# Altium footprint library TranDangKhoa-LIB.PcbLib: 1435 footprints (part 70 of 90)
Each footprint in its own frame and in the unit in brackets; x right, y up, seen from the top. Pads: shape width x height; smd on the part's side, far side on the other; paste and mask are expansions set on the pad; w line width, h text height; cw(c..) or ccw(c..) is an arc to the next point about the centre after c.
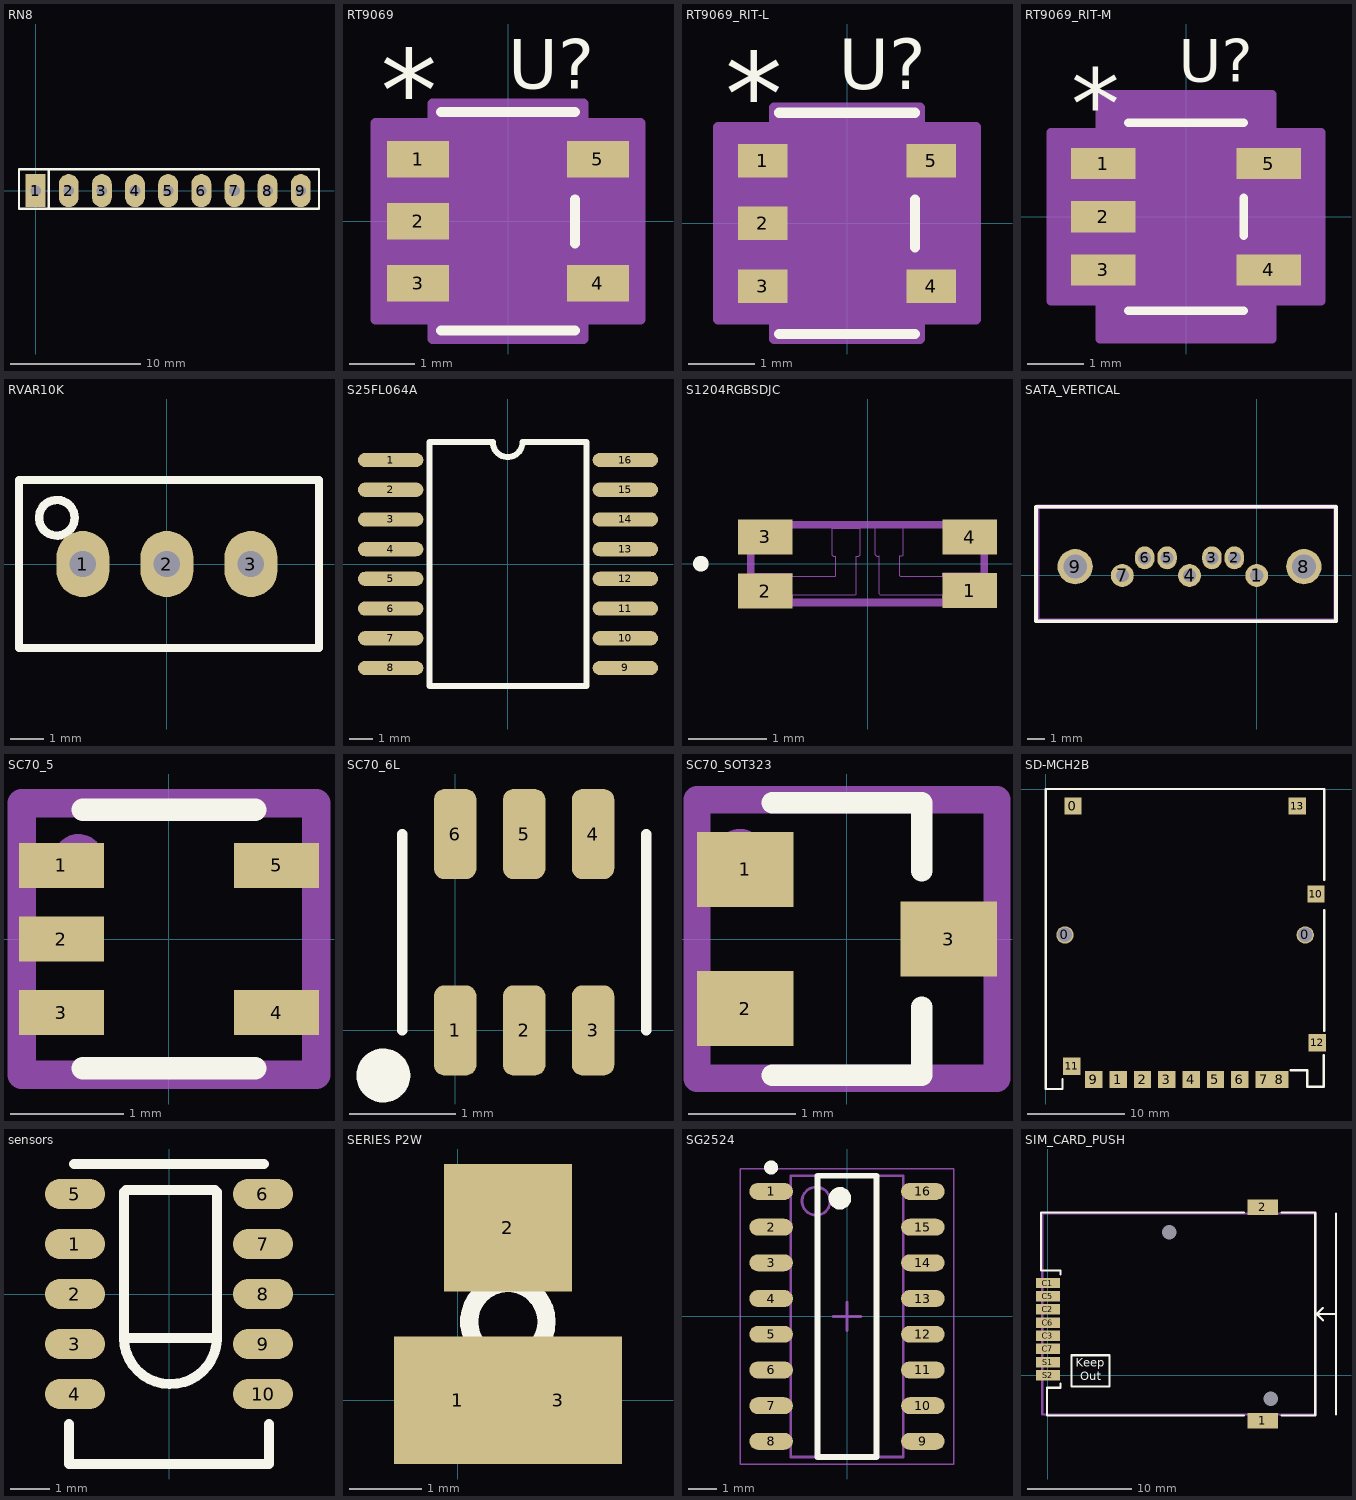
[diagram p69: the footprints below, top view; thin cyan lines are the x and y axes]

## RN8 [mil] "R SIP8, 9 Pin"
height 200
pads (9):
  rect 60x100 hole 32: 1(0,0)
  oval 60x100 hole 32: 2(100,0) 3(200,0) 4(300,0) 5(400,0) 6(500,0) 7(600,0) 8(700,0) 9(800,0)
Top Overlay:
  lines w7: 40,-55 40,65 ; -50,-55 -50,65 855,65 855,-55 -50,-55
3D body "SW3dPS-Resistor Networks-1.STEP": height 259.29, standoff -75.35, extent -42.91,-44.21 842.91,5

## RT9069 [mil]
pads (5):
  rect 37.5x22 smd paste+0 mask+0: 1(-54.25,37.4) 2(-54.25,0) 3(-54.25,-37.4) 4(54.25,-37.4) 5(54.25,37.4)
Top Overlay:
  lines w6: -40.5,-66 40.5,-66 ; -40.5,66 40.5,66 ; 40.5,-13.3 40.5,13.3
  text "U?" at 0,80 h30
  text "*" at -76.75,54.4 h50
Mechanical 13:
  lines w0: -12,61 ccw(c0,61) 12,61
  lines w1: -59,-48.4 -59,-26.4 -35.5,-26.4 -35.5,-48.4 -59,-48.4 ; -59,-11 -59,11 -35.5,11 -35.5,-11 -59,-11 ; -59,26.4 -59,48.4 -35.5,48.4 -35.5,26.4 -59,26.4 ; -35.5,-61 35.5,-61 35.5,61 -35.5,61 -35.5,-61 ; 35.5,-48.4 35.5,-26.4 59,-26.4 59,-48.4 35.5,-48.4 ; 35.5,26.4 35.5,48.4 59,48.4 59,26.4 35.5,26.4
  text "*" at -38,11.4 h50
Mechanical 15:
  region: 45.5,-71 -45.5,-71 -45.5,-59.4 -80,-59.4 -80,59.4 -45.5,59.4 -45.5,71 45.5,71 45.5,59.4 80,59.4 80,-59.4 45.5,-59.4
  lines w6: -80,-59.4 -45.5,-59.4 -45.5,-71 45.5,-71 45.5,-59.4 80,-59.4 80,59.4 45.5,59.4 45.5,71 -45.5,71 -45.5,59.4 -80,59.4 -80,-59.4
3D body "SOT_69-C0GB_RIT.step": height 51.1, standoff 0, extent -59.02,-60.98 59.02,60.98

## RT9069_RIT-L [mil]
pads (5):
  rect 29.5x20 smd paste+0 mask+0: 1(-50.25,37.4) 2(-50.25,0) 3(-50.25,-37.4) 4(50.25,-37.4) 5(50.25,37.4)
Top Overlay:
  lines w6: -40.5,-66 40.5,-66 ; -40.5,66 40.5,66 ; 40.5,-14.3 40.5,14.3
  text "U?" at -5,80 h30
  text "*" at -72.75,52.4 h50
Mechanical 13:
  lines w0: -12,61 ccw(c0,61) 12,61
  lines w1: -59,-48.4 -35.5,-48.4 -35.5,-26.4 -59,-26.4 -59,-48.4 ; -59,-11 -35.5,-11 -35.5,11 -59,11 -59,-11 ; -59,26.4 -35.5,26.4 -35.5,48.4 -59,48.4 -59,26.4 ; -35.5,-61 -35.5,61 35.5,61 35.5,-61 -35.5,-61 ; 35.5,-48.4 59,-48.4 59,-26.4 35.5,-26.4 35.5,-48.4 ; 35.5,26.4 59,26.4 59,48.4 35.5,48.4 35.5,26.4
  text "*" at -38,9.4 h50
Mechanical 15:
  region: 43.5,-69 -43.5,-69 -43.5,-57.4 -77,-57.4 -77,57.4 -43.5,57.4 -43.5,69 43.5,69 43.5,57.4 77,57.4 77,-57.4 43.5,-57.4
  lines w6: -77,-57.4 -77,57.4 -43.5,57.4 -43.5,69 43.5,69 43.5,57.4 77,57.4 77,-57.4 43.5,-57.4 43.5,-69 -43.5,-69 -43.5,-57.4 -77,-57.4
3D body "SOT_69-C0GB_RIT.step": height 51.1, standoff 0, extent -59.02,-60.98 59.02,60.98

## RT9069_RIT-M [mil]
pads (5):
  rect 45.5x22 smd paste+0 mask+0: 1(-58.25,37.4) 2(-58.25,0) 3(-58.25,-37.4) 4(58.25,-37.4) 5(58.25,37.4)
Top Overlay:
  lines w6: -40.5,-66 40.5,-66 ; -40.5,66 40.5,66 ; 40.5,-13.3 40.5,13.3
  text "*" at -80.75,54.4 h50
  text "U?" at -5,95 h30
Mechanical 13:
  lines w0: -12,61 ccw(c0,61) 12,61
  lines w1: -59,-48.4 -35.5,-48.4 -35.5,-26.4 -59,-26.4 -59,-48.4 ; -59,-11 -35.5,-11 -35.5,11 -59,11 -59,-11 ; -59,26.4 -35.5,26.4 -35.5,48.4 -59,48.4 -59,26.4 ; -35.5,-61 -35.5,61 35.5,61 35.5,-61 -35.5,-61 ; 35.5,-48.4 59,-48.4 59,-26.4 35.5,-26.4 35.5,-48.4 ; 35.5,26.4 59,26.4 59,48.4 35.5,48.4 35.5,26.4
  text "*" at -38,11.4 h50
Mechanical 15:
  region: 60.5,-86 -60.5,-86 -60.5,-59.4 -95,-59.4 -95,59.4 -60.5,59.4 -60.5,86 60.5,86 60.5,59.4 95,59.4 95,-59.4 60.5,-59.4
  lines w6: -95,-59.4 -95,59.4 -60.5,59.4 -60.5,86 60.5,86 60.5,59.4 95,59.4 95,-59.4 60.5,-59.4 60.5,-86 -60.5,-86 -60.5,-59.4 -95,-59.4
3D body "SOT_69-C0GB_RIT.step": height 51.1, standoff 0, extent -59.02,-60.98 59.02,60.98

## RVAR10K [mm] "Bien tro vi chinh"
pads (3):
  oval 1.6x2 hole 0.8: 1(-2.54,0) 2(0,0) 3(2.54,0)
Top Overlay:
  circle w0.254: c-3.327,1.397 r0.539
  lines w0.254: -4.47,-2.54 -4.47,2.54 4.597,2.54 4.597,-2.54 -4.47,-2.54
3D body "User Library-Potenciometro Vertical.step": height 12.02, standoff -5.48, extent -4.537,-2.4 4.663,2.4

## S25FL064A [mil]
pads (16):
  oval 110x24 smd: 1(-197.5,175) 2(-197.5,125) 3(-197.5,75) 4(-197.5,25) 5(-197.5,-25) 6(-197.5,-75) 7(-197.5,-125) 8(-197.5,-175) 9(197.5,-175) 10(197.5,-125) 11(197.5,-75) 12(197.5,-25) 13(197.5,25) 14(197.5,75) 15(197.5,125) 16(197.5,175)
Top Overlay:
  lines w10: -132.5,-205 -132.5,205 -25.5,205 ccw(c-0.5,205) 24.5,205 132.5,205 132.5,-205 -132.5,-205

## S1204RGBSDJC [mm]
pads (4):
  rect 0.7x0.45 smd paste-1 mask+0: 1(1.313,-0.345)
  rect 0.7x0.45 smd paste-1 mask+0.102: 2(-1.313,-0.353) 3(-1.313,0.345)
  rect 0.7x0.45 smd paste-1: 4(1.313,0.343)
Top Overlay:
  circle w0.1: c-2.14,0 r0.05
Top Paste:
  rectangle: 1.364,-0.538 1.626,-0.46
  rectangle: 0.996,-0.46 1.626,-0.142
  rectangle: 0.996,0.145 1.626,0.462
  rectangle: 1.364,0.462 1.626,0.541
  region: -1.367,0.551 -1.628,0.551 -1.628,0.472 -1.367,0.472
  region: -0.998,0.472 -1.628,0.472 -1.628,0.155 -0.998,0.155
  region: -1.367,-0.478 -1.628,-0.478 -1.628,-0.556 -1.367,-0.556
  region: -0.998,-0.16 -1.628,-0.16 -1.628,-0.478 -0.998,-0.478
Top Solder:
  rectangle: 0.973,-0.462 1.651,-0.135
  rectangle: 1.311,-0.556 1.651,-0.462
  rectangle: 1.311,0.46 1.651,0.554
  rectangle: 0.973,0.132 1.651,0.46
  region: -1.311,0.559 -1.651,0.559 -1.651,0.465 -1.311,0.465
  region: -0.973,0.465 -1.651,0.465 -1.651,0.137 -0.973,0.137
  region: -1.308,-0.467 -1.648,-0.467 -1.648,-0.561 -1.308,-0.561
  region: -0.97,-0.14 -1.648,-0.14 -1.648,-0.467 -0.97,-0.467
Mechanical 13:
  lines w0.1: -1.5,-0.5 -1.5,0.5 1.5,0.5 1.5,-0.5 -1.5,-0.5
Mechanical 16:
  lines w0.001: -1.471,-0.292 -1.471,-0.122 -0.968,-0.122 -0.965,-0.124 -0.965,-0.163 -0.417,-0.163 -0.409,-0.155 -0.409,0.097 -0.442,0.097 -0.455,0.109 -0.455,0.455 -0.452,0.457 -0.094,0.457 -0.094,0.114 -0.114,0.094 -0.145,0.094 -0.147,0.097 -0.147,-0.391 -0.157,-0.401 -0.958,-0.401 -0.963,-0.406 -0.963,-0.46 ; 0.965,-0.457 0.965,-0.404 0.96,-0.399 0.16,-0.399 0.15,-0.389 0.15,0.099 0.147,0.097 0.117,0.097 0.097,0.117 0.097,0.46 0.455,0.46 0.457,0.457 0.457,0.112 0.445,0.099 0.411,0.099 0.411,-0.152 0.419,-0.16 0.968,-0.16 0.968,-0.122 0.97,-0.119 1.473,-0.119 1.473,-0.29
3D body: height 1.27, standoff 0.77, extent 0,-0.249 0.497,0.249
3D body: height 1.27, standoff 0.77, extent -0.249,-0.254 0.249,0.244
3D body: height 1.27, standoff 0.77, extent -0.497,-0.249 0,0.249
3D body: height 1.8, standoff 0.88, extent 0.05,-0.445 0.96,0.465
3D body: height 1.8, standoff 0.88, extent -0.947,-0.448 -0.037,0.463
3D body: height 1.8, standoff 0.89, extent -0.515,-0.449 0.501,0.463
3D body: height 1, standoff 0, extent 0,-0.461 1.473,0.465
3D body: height 1.34, standoff 0.33, extent 0.043,-0.449 0.953,0.463
3D body: height 1.34, standoff 0.33, extent -0.956,-0.451 -0.045,0.462
3D body: height 1, standoff 0, extent -1.488,-0.46 0,0.468

## SATA_VERTICAL [mm]
pads (9):
  round 1.3 hole 0.74: 1(0,0) 4(-3.81,0) 7(-7.62,0)
  oval 1.1x1.3 hole 0.74: 2(-1.27,1) 3(-2.54,1) 5(-5.08,1) 6(-6.35,1)
  round 2 hole 1.35: 8(2.67,0.5) 9(-10.29,0.5)
Top Overlay:
  lines w0.2: -12.51,-2.6 4.49,-2.6 4.49,3.9 -12.51,3.9 -12.51,-2.6
Mechanical 16:
  lines w0.254: -12.43,-2.555 4.47,-2.555 4.47,3.895 -12.43,3.895 -12.43,-2.555
Mechanical 29:
  text ".Designator" at -5.5,-0.2 h1.52
3D body "471554001.stp": height 8.43, standoff -2.62, extent -12.43,-2.555 4.47,3.895

## SC70_5 [mm]
pads (5):
  rect 0.75x0.4 smd mask+0.025: 1(-0.95,0.65) 2(-0.95,0) 3(-0.95,-0.65) 4(0.95,-0.65) 5(0.95,0.65)
Top Overlay:
  lines w0.2: -0.762,-1.143 0.762,-1.143 ; -0.762,1.143 0.762,1.143
Mechanical 16:
  circle w0.254: c-0.8,0.7 r0.1
  lines w0.254: -1.3,-1.2 1.3,-1.2 1.3,1.2 -1.3,1.2 -1.3,-1.2
Mechanical 29:
  text ".Designator" at 0.7,0.1 h0.6
3D body: height 1.1, standoff 0, extent -0.762,-1.143 0.762,1.143
3D body: height 0.8, standoff 0, extent -1.206,0.445 -0.762,0.826
3D body: height 0.8, standoff 0, extent -1.206,-0.191 -0.762,0.191
3D body: height 0.8, standoff 0, extent -1.206,-0.826 -0.762,-0.445
3D body: height 0.8, standoff 0, extent 0.762,-0.826 1.206,-0.445
3D body: height 0.8, standoff 0, extent 0.762,0.445 1.206,0.826

## SC70_6L [mm]
pads (6):
  rrect50% 0.4x0.85 smd: 1(0,0) 2(0.65,0) 3(1.3,0) 4(1.3,1.85) 5(0.65,1.85) 6(0,1.85)
Top Overlay:
  circle w0.254: c-0.677,-0.425 r0.127
  lines w0.1: -0.5,0 -0.5,1.85 ; 1.8,0 1.8,1.85
3D body: height 0.25, standoff 0.13, extent -0.073,1.015 0.105,1.752
3D body: height 0.13, standoff 0, extent -0.073,1.688 0.105,2.225
3D body: height 0.25, standoff 0.13, extent 0.577,1.015 0.755,1.752
3D body: height 0.13, standoff 0, extent 0.577,1.688 0.755,2.225
3D body: height 0.25, standoff 0.13, extent 1.227,1.015 1.405,1.752
3D body: height 0.13, standoff 0, extent 1.227,1.688 1.405,2.225
3D body: height 0.25, standoff 0.13, extent -0.105,0.098 0.073,0.835
3D body: height 0.13, standoff 0, extent -0.105,-0.375 0.073,0.162
3D body: height 0.25, standoff 0.13, extent 0.545,0.098 0.723,0.835
3D body: height 0.13, standoff 0, extent 0.545,-0.375 0.723,0.162
3D body: height 0.13, standoff 0, extent 1.205,-0.375 1.383,0.162
3D body: height 0.25, standoff 0.13, extent 1.205,0.098 1.383,0.835
3D body: height 0.64, standoff 0, extent -0.429,0.252 1.729,1.7

## SC70_SOT323 [mm]
pads (3):
  rect 0.9x0.7 smd: 1(-0.95,0.65) 2(-0.95,-0.65) 3(0.95,0)
Top Overlay:
  lines w0.2: -0.699,-1.27 0.699,-1.27 0.699,-0.635 ; -0.699,1.27 0.699,1.27 0.699,0.635
Mechanical 16:
  circle w0.254: c-1,0.8 r0.1
  lines w0.254: -1.4,-1.3 1.4,-1.3 1.4,1.3 -1.4,1.3 -1.4,-1.3
Mechanical 29:
  text ".Designator" at -0.5,-0.3 h0.6
3D body: height 1.1, standoff 0, extent -0.699,-1.27 0.699,1.27
3D body: height 0.75, standoff 0, extent -1.27,0.318 -0.699,1.016
3D body: height 0.75, standoff 0, extent -1.27,-1.016 -0.699,-0.318
3D body: height 0.75, standoff 0, extent 0.699,-0.318 1.27,0.381

## SD-MCH2B [mil]
pads (16):
  round 70 hole 59.05 unplated: 0(76.77,-590.55) 0(1049.21,-590.55)
  rect 70x70 smd: 0(109.25,-68.9) 1(292.32,-1175.55) 2(390.75,-1175.55) 3(489.17,-1175.55) 4(587.6,-1175.55) 5(686.02,-1175.55) 6(784.45,-1175.55) 7(882.87,-1175.55) 8(946.85,-1175.55) 9(193.9,-1175.55) 10(1092.52,-425.2) 11(104.33,-1122.05) 12(1098.43,-1026.38) 13(1016.73,-68.9)
Top Overlay:
  lines w10: 66.93,-1174.07 66.93,-1213.98 0,-1213.98 0,-698.98 0,0 1125.98,0 1125.98,-367.54 ; 990.92,-1138.62 1057.09,-1138.62 1057.09,-1205.55 1124.02,-1205.55 1124.02,-1077.57 ; 1125.98,-978.57 1125.98,-690.55 1125.98,-490.53

## sensors [mil]
pads (10):
  oval 60x30 smd: 1(-94.09,50) 2(-94.09,0) 3(-94.09,-50) 4(-94.09,-100) 5(-94.09,100) 6(93.91,100) 7(94.09,50) 8(94.09,0) 9(94.09,-50) 10(94.09,-100)
Top Overlay:
  lines w10: -100,-130 -100,-170 100,-170 100,-130 ; -95,130 95,130 ; 47.87,-45.56 cw(c1.4,-43.65) -45.09,-44 ; -45.09,-44 47.91,-44 47.91,102 45.91,104 -43.09,104 -45.09,102 -45.09,-44
3D body "SHT11_2.step": height 103, standoff 0.56, extent -99.09,-170.27 97.76,125

## SERIES P2W [mil]
pads (3):
  rect 70x70 smd: 1(0,0) 2(27.56,94.49) 3(55.12,0)
Top Overlay:
  circle w10: c27.46,43 r21.2

## SG2524 [mm] "SOP, 16-Leads, Body 10.00x4.00mm, Pitch 1.27mm, IPC Medium Density"
height 1.75
pads (16):
  oval 1.55x0.6 smd: 1(-2.7,4.445) 2(-2.7,3.175) 3(-2.7,1.905) 4(-2.7,0.635) 5(-2.7,-0.635) 6(-2.7,-1.905) 7(-2.7,-3.175) 8(-2.7,-4.445) 9(2.7,-4.445) 10(2.7,-3.175) 11(2.7,-1.905) 12(2.7,-0.635) 13(2.7,0.635) 14(2.7,1.905) 15(2.7,3.175) 16(2.7,4.445)
Top Overlay:
  circle w0.25: c-2.7,5.295 r0.125
  circle w0.4: c-0.25,4.2 r0.2
  lines w0.2: -1.05,-5 -1.05,5 1.05,5 1.05,-5 -1.05,-5
Mechanical 13:
  circle w0.1: c-1.1,4.1 r0.5
  lines w0.1: -2,-5 -2,5 2,5 2,-5 -2,-5
Mechanical 15:
  lines w0.05: -3.8,-5.25 -3.8,5.25 3.8,5.25 3.8,-5.25 -3.8,-5.25
  lines w0.1: -0.5,0 0.5,0 ; 0,-0.5 0,0.5
3D body: height 1.75, standoff 0.25, extent -2,-5 2,5

## SIM_CARD_PUSH [mm] "Creator MM"
height 1.8
pads (12):
  rect 2.95x1.5 smd: 1(20.7,-4.37) 2(20.7,16.18)
  rrect70% 0x0 hole 1.4: 3(21.47,-2.26) 4(11.67,13.79)
  rect 2.3x1 smd mask+0.051: C1(0,8.89) C2(0,6.35) C3(0,3.81) C5(0,7.62) C6(0,5.08) C7(0,2.54) S1(0,1.27) S2(0,0)
Top Overlay:
  lines w0.2: 1.19,9.71 1.19,10.1 -0.65,10.1 -0.65,15.68 18.9,15.68 ; 1.2,-0.8 1.2,-1.2 -0.1,-1.2 -0.1,-3.87 18.9,-3.87 ; 22.5,-3.87 25.75,-3.87 25.75,15.68 22.5,15.68 ; 26.5,5.3 25.9,5.9 ; 26.5,6.5 25.9,5.9 ; 27.75,-3.77 27.75,15.58 ; 27.75,5.9 25.9,5.9 ; 2.25,-1.07 5.95,-1.07 5.95,1.93 2.25,1.93 2.25,-1.07
  text "Keep" at 2.7,0.8 h0.8
  text "Out" at 3.1,-0.5 h0.8
Mechanical 16:
  lines w0.2: -0.55,-3.77 25.75,-3.77 25.75,15.58 -0.55,15.58 -0.55,-3.77
Mechanical 29:
  text ".Designator" at 14.5,6 h1.52
3D body "475531001.stp": height 1.8, standoff -0.7, extent -0.55,-4.6 25.95,16.35